# Altium footprint library goldpin_male_pcb.PcbLib: 157 footprints (part 4 of 10)
Each footprint in its own frame and in the unit in brackets; x right, y up, seen from the top. Pads: shape width x height; smd on the part's side, far side on the other; paste and mask are expansions set on the pad; w line width, h text height; cw(c..) or ccw(c..) is an arc to the next point about the centre after c.
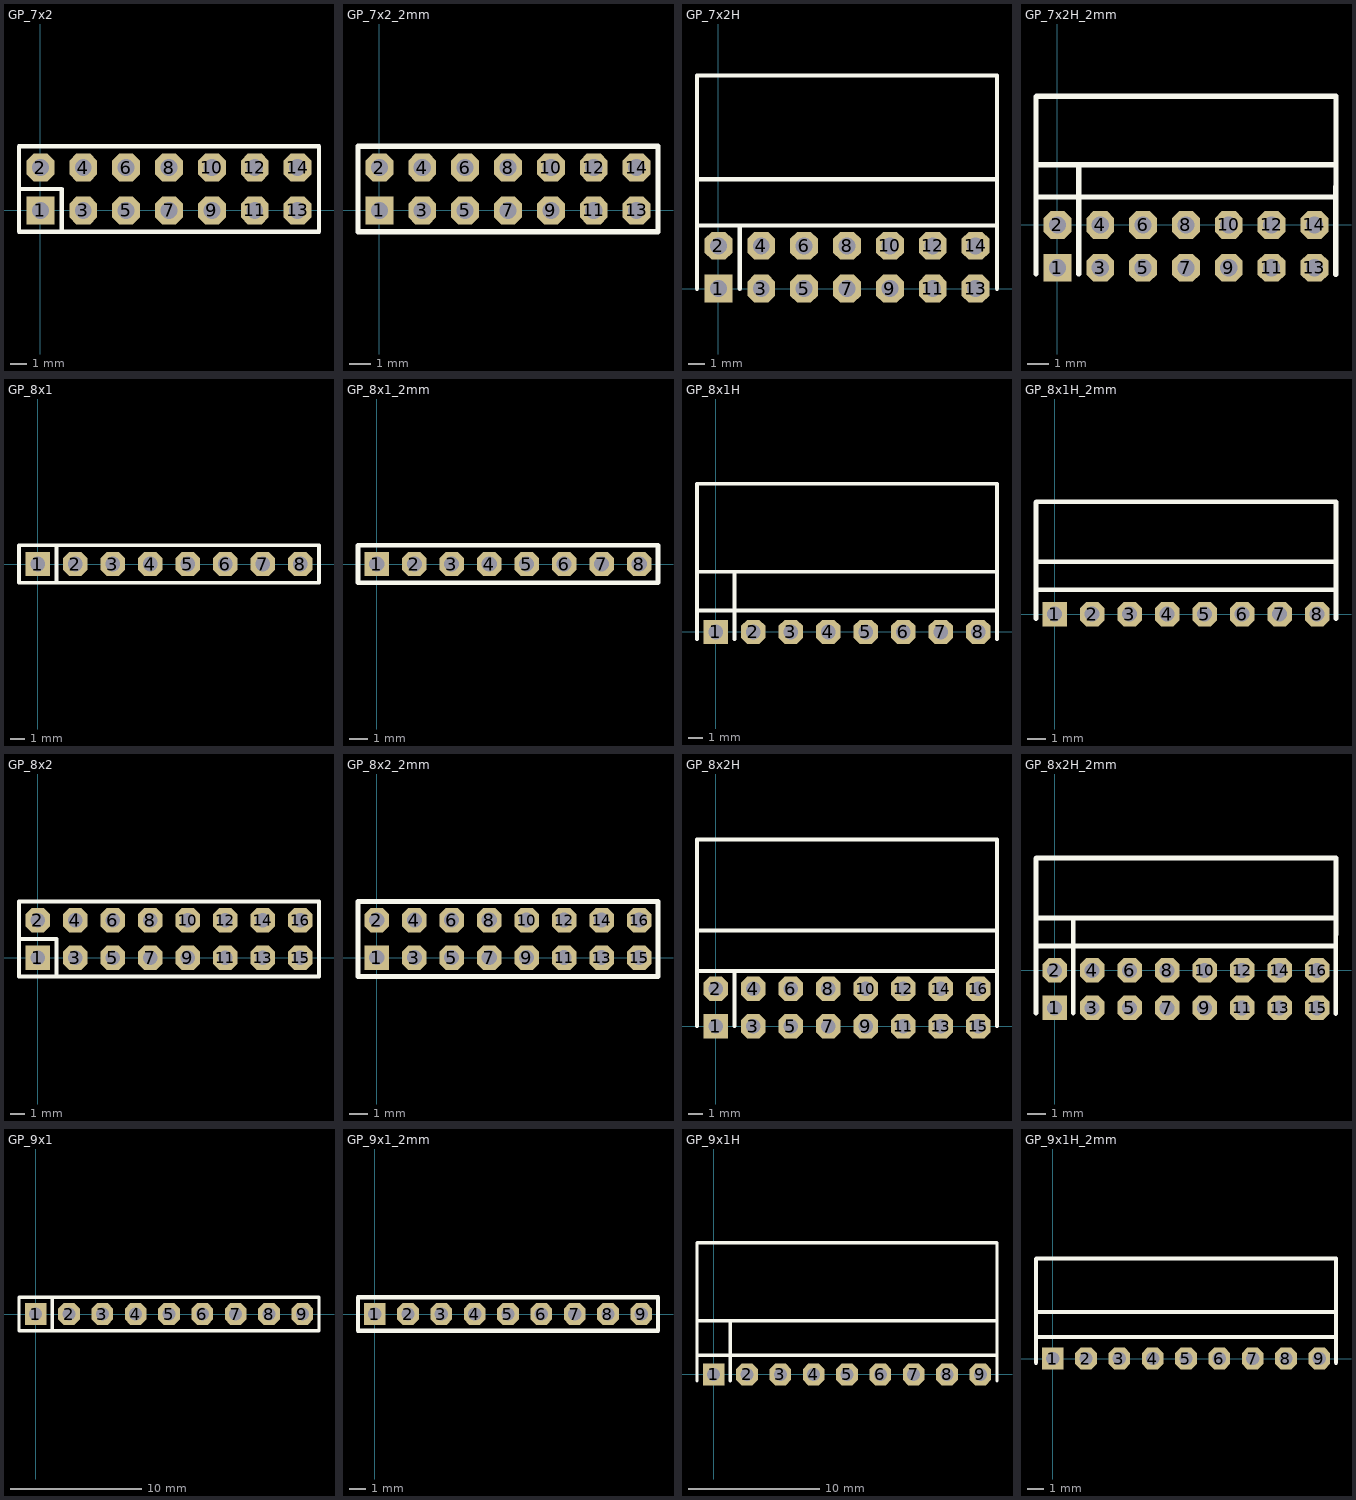
[diagram p3: the footprints below, top view; thin cyan lines are the x and y axes]

## GP_7x2 [mil]
pads (14):
  rect 65x65 hole 39.37: 1(0,0)
  oct 65x65 hole 39.37: 2(0,100) 3(100,0) 4(100,100) 5(200,0) 6(200,100) 7(300,0) 8(300,100) 9(400,0) 10(400,100) 11(500,0) 12(500,100) 13(600,0) 14(600,100)
Top Overlay:
  lines w10: -50,50 50,50 50,-50 ; -50,-50 -50,150 650,150 650,-50 -50,-50
3D body "Samtec-TSW-107-23-F-D.STEP": height 330, standoff -115, extent -50,-50 650,150

## GP_7x2_2mm [mm]
height 4.45
pads (14):
  rect 1.3x1.3 hole 0.8: 1(0,0)
  oct 1.3x1.3 hole 0.8: 2(0,2) 3(2,0) 4(2,2) 5(4,0) 6(4,2) 7(6,0) 8(6,2) 9(8,0) 10(8,2) 11(10,0) 12(10,2) 13(12,0) 14(12,2)
Top Overlay:
  lines w0.254: -1,-1 -1,2.999 13,2.999 13,-1 -1,-1
3D body "Samtec-TMM-107-03-G-D.STEP": height 6.51, standoff -1.69, extent -1,-0.968 13,2.969

## GP_7x2H [mil]
pads (14):
  rect 65x65 hole 39.37: 1(0,0)
  oct 65x65 hole 39.37: 2(0,100) 3(100,0) 4(100,100) 5(200,0) 6(200,100) 7(300,0) 8(300,100) 9(400,0) 10(400,100) 11(500,0) 12(500,100) 13(600,0) 14(600,100)
Top Overlay:
  lines w10: -50,0 -50,180.31 -50,497.64 650,497.64 650,0 ; -50,147.24 650,147.24 ; -50,255.51 650,255.51 ; 49.21,255.51 50,254.72 ; 50,0 50,147.24
3D body "Samtec-TSW-107-08-F-D-RA.STEP": height 220.08, standoff -89.92, extent -50,-12.5 650,490

## GP_7x2H_2mm [mm]
height 4.45
pads (14):
  rect 1.3x1.3 hole 0.8: 1(0,-2)
  oct 1.3x1.3 hole 0.8: 2(0,0) 3(2,-2) 4(2,0) 5(4,-2) 6(4,0) 7(6,-2) 8(6,0) 9(8,-2) 10(8,0) 11(10,-2) 12(10,0) 13(12,-2) 14(12,0)
Top Overlay:
  lines w0.254: -1,-2.275 -1,1.822 -1,5.973 ; -1,1.3 13.004,1.3 ; -1,2.8 13,2.8 ; 0.99,-2.275 0.99,2.775 ; 13,-2.3 13.01,5.975
  lines w0.256: -1,5.973 -0.973,6 13.01,6
3D body "Samtec-TMM-107-03-G-D-RA.STEP": height 3.97, standoff -3.02, extent -1.025,-2.261 12.975,5.961

## GP_8x1 [mil]
pads (8):
  rect 65x65 hole 39.37: 1(0,0)
  oct 65x65 hole 39.37: 2(100,0) 3(200,0) 4(300,0) 5(400,0) 6(500,0) 7(600,0) 8(700,0)
Top Overlay:
  lines w10: 50,-50 50,50 ; -50,-50 750,-50 750,50 -50,50 -50,-50
3D body "Samtec-TSW-108-23-F-S.STEP": height 330, standoff -115, extent -50,-50 750,50

## GP_8x1_2mm [mm]
height 4.45
pads (8):
  rect 1.3x1.3 hole 0.8: 1(0,0)
  oct 1.3x1.3 hole 0.8: 2(2,0) 3(4,0) 4(6,0) 5(8,0) 6(10,0) 7(12,0) 8(14,0)
Top Overlay:
  lines w0.254: -1,-1 15,-1 15,1 -1,1 -1,-1
3D body "Samtec-TMM-108-03-G-S.STEP": height 5.51, standoff -2.69, extent -1,-0.99 15,0.991

## GP_8x1H [mil]
pads (8):
  rect 65x65 hole 39.37: 1(0,0)
  oct 65x65 hole 39.37: 2(100,0) 3(200,0) 4(300,0) 5(400,0) 6(500,0) 7(600,0) 8(700,0)
Top Overlay:
  lines w10: -50,-19.68 -50,80.31 -50,395 750,395 750,-19.68 ; -50,57.24 750,57.24 ; -50,160.51 750,160.51 ; 50,-19.68 50,80.31 50,160
3D body "Samtec-TSW-108-08-F-S-RA.STEP": height 120, standoff -90, extent -50,-10 750,392.5

## GP_8x1H_2mm [mm]
height 4.45
pads (8):
  rect 1.3x1.3 hole 0.8: 1(0,0)
  oct 1.3x1.3 hole 0.8: 2(2,0) 3(4,0) 4(6,0) 5(8,0) 6(10,0) 7(12,0) 8(14,0)
Top Overlay:
  lines w0.254: -1,-0.25 -1,1.822 -1,5.973 ; -1,1.3 15,1.3 ; -1,2.8 15,2.8
  lines w0.256: -1,5.973 -0.973,6 15,6 15,-0.25
3D body "Samtec-TMM-108-03-G-S-RA.STEP": height 1.99, standoff -3.04, extent -1,-0.25 15,5.973

## GP_8x2 [mil]
pads (16):
  rect 65x65 hole 39.37: 1(0,0)
  oct 65x65 hole 39.37: 2(0,100) 3(100,0) 4(100,100) 5(200,0) 6(200,100) 7(300,0) 8(300,100) 9(400,0) 10(400,100) 11(500,0) 12(500,100) 13(600,0) 14(600,100) 15(700,0) 16(700,100)
Top Overlay:
  lines w10: -50,50 50,50 50,-50 ; -50,-50 -50,150 750,150 750,-50 -50,-50
3D body "Samtec-TSW-108-23-F-D.STEP": height 330, standoff -115, extent -50,-50 750,150

## GP_8x2_2mm [mm]
height 4.45
pads (16):
  rect 1.3x1.3 hole 0.8: 1(0,0)
  oct 1.3x1.3 hole 0.8: 2(0,2) 3(2,0) 4(2,2) 5(4,0) 6(4,2) 7(6,0) 8(6,2) 9(8,0) 10(8,2) 11(10,0) 12(10,2) 13(12,0) 14(12,2) 15(14,0) 16(14,2)
Top Overlay:
  lines w0.254: -1,-1 -1,2.999 15,2.999 15,-1 -1,-1
3D body "Samtec-TMM-108-03-G-D.STEP": height 6.51, standoff -1.69, extent -1,-0.968 15,2.969

## GP_8x2H [mil]
pads (16):
  rect 65x65 hole 39.37: 1(0,0)
  oct 65x65 hole 39.37: 2(0,100) 3(100,0) 4(100,100) 5(200,0) 6(200,100) 7(300,0) 8(300,100) 9(400,0) 10(400,100) 11(500,0) 12(500,100) 13(600,0) 14(600,100) 15(700,0) 16(700,100)
Top Overlay:
  lines w10: -50,0 -50,180.31 -50,497.64 750,497.64 750,0 ; -50,147.24 750,147.24 ; -50,255.51 750,255.51 ; 49.21,255.51 50,254.72 ; 50,0 50,147.24
3D body "Samtec-TSW-108-08-F-D-RA.STEP": height 220, standoff -90, extent -50,-12.5 750,490

## GP_8x2H_2mm [mm]
height 4.45
pads (16):
  rect 1.3x1.3 hole 0.8: 1(0,-2)
  oct 1.3x1.3 hole 0.8: 2(0,0) 3(2,-2) 4(2,0) 5(4,-2) 6(4,0) 7(6,-2) 8(6,0) 9(8,-2) 10(8,0) 11(10,-2) 12(10,0) 13(12,-2) 14(12,0) 15(14,-2) 16(14,0)
Top Overlay:
  lines w0.254: -1,-2.275 -1,1.822 -1,5.973 ; -1,1.3 15,1.3 ; -1,2.8 15.006,2.8 ; 0.99,-2.275 0.99,2.775 ; 15,-2.3 15.01,5.975
  lines w0.256: -1,5.973 -0.973,6 15.01,6
3D body "Samtec-TMM-108-03-G-D-RA.STEP": height 3.97, standoff -3.02, extent -1.025,-2.261 14.975,5.961

## GP_9x1 [mil]
pads (9):
  rect 65x65 hole 39.37: 1(0,0)
  oct 65x65 hole 39.37: 2(100,0) 3(200,0) 4(300,0) 5(400,0) 6(500,0) 7(600,0) 8(700,0) 9(800,0)
Top Overlay:
  lines w10: 50,-50 50,45 ; -50,-50 850,-50 850,50 -50,50 -50,-50
3D body "Samtec-TSW-109-23-F-S.STEP": height 330, standoff -115, extent -50,-50 850,50

## GP_9x1_2mm [mm]
height 4.45
pads (9):
  rect 1.3x1.3 hole 0.8: 1(0,0)
  oct 1.3x1.3 hole 0.8: 2(2,0) 3(4,0) 4(6,0) 5(8,0) 6(10,0) 7(12,0) 8(14,0) 9(16,0)
Top Overlay:
  lines w0.254: -1,-1 -1,1 17,1 17,-1 -1,-1
3D body "Samtec-TMM-109-03-G-S.STEP": height 5.51, standoff -2.69, extent -1,-0.99 17,0.991

## GP_9x1H [mil]
pads (9):
  rect 65x65 hole 39.37: 1(0,0)
  oct 65x65 hole 39.37: 2(100,0) 3(200,0) 4(300,0) 5(400,0) 6(500,0) 7(600,0) 8(700,0) 9(800,0)
Top Overlay:
  lines w10: -50,-19.68 -50,80.31 -50,395 850,395 850,-19.68 ; -50,57.24 850,57.24 ; -50,160.51 850,160.51 ; 50,-19.68 50,80.31 50,160
3D body "Samtec-TSW-109-08-F-S-RA.STEP": height 120, standoff -90, extent -50,-10 850,392.5

## GP_9x1H_2mm [mm]
height 4.45
pads (9):
  rect 1.3x1.3 hole 0.8: 1(0,0)
  oct 1.3x1.3 hole 0.8: 2(2,0) 3(4,0) 4(6,0) 5(8,0) 6(10,0) 7(12,0) 8(14,0) 9(16,0)
Top Overlay:
  lines w0.254: -1,-0.25 -1,1.822 -1,5.973 ; -1,1.3 17,1.3 ; -1,2.8 17,2.8
  lines w0.256: -1,5.973 -0.973,6 17,6 17,-0.25
3D body "Samtec-TMM-109-03-G-S-RA.STEP": height 1.99, standoff -3.04, extent -1,-0.25 17,5.973